# Altium footprint library ref-packages-longpad.PCBLIB: 1527 footprints (part 13 of 103)
Each footprint in its own frame and in the unit in brackets; x right, y up, seen from the top. Pads: shape width x height; smd on the part's side, far side on the other; paste and mask are expansions set on the pad; w line width, h text height; cw(c..) or ccw(c..) is an arc to the next point about the centre after c.
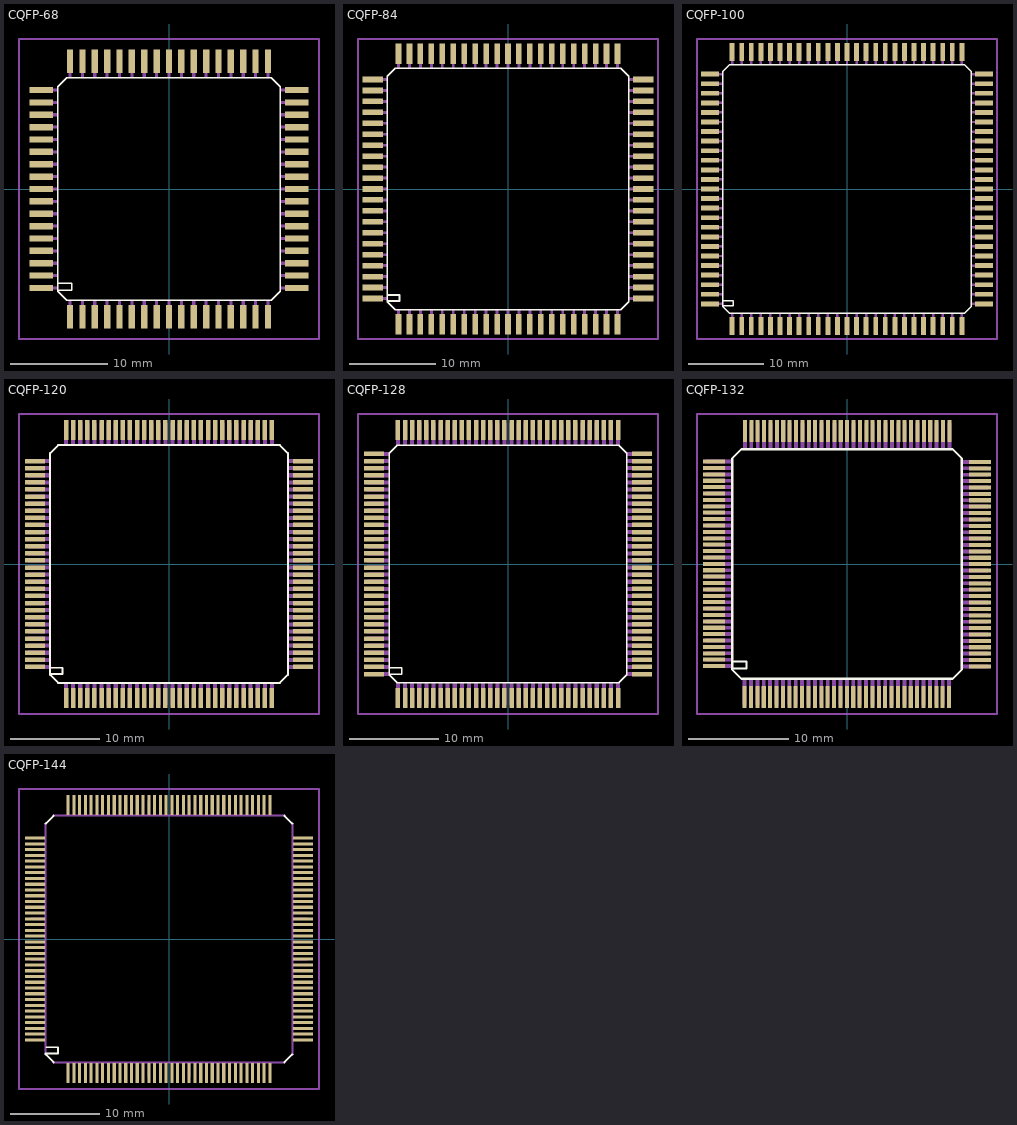
[diagram p12: the footprints below, top view; thin cyan lines are the x and y axes]

## CQFP-68 [mm]
pads (68):
  rect 0.65x2.4 smd: 1(-10.16,-13.1) 2(-8.89,-13.1) 3(-7.62,-13.1) 4(-6.35,-13.1) 5(-5.08,-13.1) 6(-3.81,-13.1) 7(-2.54,-13.1) 8(-1.27,-13.1) 9(0,-13.1) 10(1.27,-13.1) 11(2.54,-13.1) 12(3.81,-13.1) 13(5.08,-13.1) 14(6.35,-13.1) 15(7.62,-13.1) 16(8.89,-13.1) 17(10.16,-13.1) 35(10.16,13.1) 36(8.89,13.1) 37(7.62,13.1) 38(6.35,13.1) 39(5.08,13.1) 40(3.81,13.1) 41(2.54,13.1) 42(1.27,13.1) 43(0,13.1) 44(-1.27,13.1) 45(-2.54,13.1) 46(-3.81,13.1) 47(-5.08,13.1) 48(-6.35,13.1) 49(-7.62,13.1) 50(-8.89,13.1) 51(-10.16,13.1)
  rect 2.4x0.65 smd: 18(13.1,-10.16) 19(13.1,-8.89) 20(13.1,-7.62) 21(13.1,-6.35) 22(13.1,-5.08) 23(13.1,-3.81) 24(13.1,-2.54) 25(13.1,-1.27) 26(13.1,0) 27(13.1,1.27) 28(13.1,2.54) 29(13.1,3.81) 30(13.1,5.08) 31(13.1,6.35) 32(13.1,7.62) 33(13.1,8.89) 34(13.1,10.16) 52(-13.1,10.16) 53(-13.1,8.89) 54(-13.1,7.62) 55(-13.1,6.35) 56(-13.1,5.08) 57(-13.1,3.81) 58(-13.1,2.54) 59(-13.1,1.27) 60(-13.1,0) 61(-13.1,-1.27) 62(-13.1,-2.54) 63(-13.1,-3.81) 64(-13.1,-5.08) 65(-13.1,-6.35) 66(-13.1,-7.62) 67(-13.1,-8.89) 68(-13.1,-10.16)
Top Overlay:
  lines w0.152: -11.3,-9.7 -10,-9.7 -10,-10.4 -11.4,-10.4 ; -11.4,-10.4 -11.4,10.5 -10.5,11.4 10.5,11.4 11.4,10.5 11.4,-10.5 10.5,-11.4 -10.5,-11.4 -11.4,-10.5 -11.4,-10.4
Mechanical 16:
  rectangle: -10.32,-13.9 -10,-11.4
  rectangle: -9.05,-13.9 -8.73,-11.4
  rectangle: -7.78,-13.9 -7.46,-11.4
  rectangle: -6.51,-13.9 -6.19,-11.4
  rectangle: -5.24,-13.9 -4.92,-11.4
  rectangle: -3.97,-13.9 -3.65,-11.4
  rectangle: -2.7,-13.9 -2.38,-11.4
  rectangle: -1.43,-13.9 -1.11,-11.4
  rectangle: -0.16,-13.9 0.16,-11.4
  rectangle: 1.11,-13.9 1.43,-11.4
  rectangle: 2.38,-13.9 2.7,-11.4
  rectangle: 3.65,-13.9 3.97,-11.4
  rectangle: 4.92,-13.9 5.24,-11.4
  rectangle: 6.19,-13.9 6.51,-11.4
  rectangle: 7.46,-13.9 7.78,-11.4
  rectangle: 8.73,-13.9 9.05,-11.4
  rectangle: 10,-13.9 10.32,-11.4
  rectangle: 11.4,-10.32 13.9,-10
  rectangle: 11.4,-9.05 13.9,-8.73
  rectangle: 11.4,-7.78 13.9,-7.46
  rectangle: 11.4,-6.51 13.9,-6.19
  rectangle: 11.4,-5.24 13.9,-4.92
  rectangle: 11.4,-3.97 13.9,-3.65
  rectangle: 11.4,-2.7 13.9,-2.38
  rectangle: 11.4,-1.43 13.9,-1.11
  rectangle: 11.4,-0.16 13.9,0.16
  rectangle: 11.4,1.11 13.9,1.43
  rectangle: 11.4,2.38 13.9,2.7
  rectangle: 11.4,3.65 13.9,3.97
  rectangle: 11.4,4.92 13.9,5.24
  rectangle: 11.4,6.19 13.9,6.51
  rectangle: 11.4,7.46 13.9,7.78
  rectangle: 11.4,8.73 13.9,9.05
  rectangle: 11.4,10 13.9,10.32
  rectangle: 10,11.4 10.32,13.9
  rectangle: 8.73,11.4 9.05,13.9
  rectangle: 7.46,11.4 7.78,13.9
  rectangle: 6.19,11.4 6.51,13.9
  rectangle: 4.92,11.4 5.24,13.9
  rectangle: 3.65,11.4 3.97,13.9
  rectangle: 2.38,11.4 2.7,13.9
  rectangle: 1.11,11.4 1.43,13.9
  rectangle: -0.16,11.4 0.16,13.9
  rectangle: -1.43,11.4 -1.11,13.9
  rectangle: -2.7,11.4 -2.38,13.9
  rectangle: -3.97,11.4 -3.65,13.9
  rectangle: -5.24,11.4 -4.92,13.9
  rectangle: -6.51,11.4 -6.19,13.9
  rectangle: -7.78,11.4 -7.46,13.9
  rectangle: -9.05,11.4 -8.73,13.9
  rectangle: -10.32,11.4 -10,13.9
  rectangle: -13.9,10 -11.4,10.32
  rectangle: -13.9,8.73 -11.4,9.05
  rectangle: -13.9,7.46 -11.4,7.78
  rectangle: -13.9,6.19 -11.4,6.51
  rectangle: -13.9,4.92 -11.4,5.24
  rectangle: -13.9,3.65 -11.4,3.97
  rectangle: -13.9,2.38 -11.4,2.7
  rectangle: -13.9,1.11 -11.4,1.43
  rectangle: -13.9,-0.16 -11.4,0.16
  rectangle: -13.9,-1.43 -11.4,-1.11
  rectangle: -13.9,-2.7 -11.4,-2.38
  rectangle: -13.9,-3.97 -11.4,-3.65
  rectangle: -13.9,-5.24 -11.4,-4.92
  rectangle: -13.9,-6.51 -11.4,-6.19
  rectangle: -13.9,-7.78 -11.4,-7.46
  rectangle: -13.9,-9.05 -11.4,-8.73
  rectangle: -13.9,-10.32 -11.4,-10
Mechanical 27:
  lines w0.2: -15.403,-15.403 15.403,-15.403 15.403,15.403 -15.403,15.403 -15.403,-15.403

## CQFP-84 [mm]
pads (84):
  rect 0.65x2.4 smd: 1(-12.7,-15.7) 2(-11.43,-15.7) 3(-10.16,-15.7) 4(-8.89,-15.7) 5(-7.62,-15.7) 6(-6.35,-15.7) 7(-5.08,-15.7) 8(-3.81,-15.7) 9(-2.54,-15.7) 10(-1.27,-15.7) 11(0,-15.7) 12(1.27,-15.7) 13(2.54,-15.7) 14(3.81,-15.7) 15(5.08,-15.7) 16(6.35,-15.7) 17(7.62,-15.7) 18(8.89,-15.7) 19(10.16,-15.7) 20(11.43,-15.7) 21(12.7,-15.7) 43(12.7,15.7) 44(11.43,15.7) 45(10.16,15.7) 46(8.89,15.7) 47(7.62,15.7) 48(6.35,15.7) 49(5.08,15.7) 50(3.81,15.7) 51(2.54,15.7) 52(1.27,15.7) 53(0,15.7) 54(-1.27,15.7) 55(-2.54,15.7) 56(-3.81,15.7) 57(-5.08,15.7) 58(-6.35,15.7) 59(-7.62,15.7) 60(-8.89,15.7) 61(-10.16,15.7) 62(-11.43,15.7) 63(-12.7,15.7)
  rect 2.4x0.65 smd: 22(15.7,-12.7) 23(15.7,-11.43) 24(15.7,-10.16) 25(15.7,-8.89) 26(15.7,-7.62) 27(15.7,-6.35) 28(15.7,-5.08) 29(15.7,-3.81) 30(15.7,-2.54) 31(15.7,-1.27) 32(15.7,0) 33(15.7,1.27) 34(15.7,2.54) 35(15.7,3.81) 36(15.7,5.08) 37(15.7,6.35) 38(15.7,7.62) 39(15.7,8.89) 40(15.7,10.16) 41(15.7,11.43) 42(15.7,12.7) 64(-15.7,12.7) 65(-15.7,11.43) 66(-15.7,10.16) 67(-15.7,8.89) 68(-15.7,7.62) 69(-15.7,6.35) 70(-15.7,5.08) 71(-15.7,3.81) 72(-15.7,2.54) 73(-15.7,1.27) 74(-15.7,0) 75(-15.7,-1.27) 76(-15.7,-2.54) 77(-15.7,-3.81) 78(-15.7,-5.08) 79(-15.7,-6.35) 80(-15.7,-7.62) 81(-15.7,-8.89) 82(-15.7,-10.16) 83(-15.7,-11.43) 84(-15.7,-12.7)
Top Overlay:
  lines w0.203: -13.9,-12.3 -12.6,-12.3 -12.6,-13 -14,-13 ; -14,-13 -14,13.1 -13.1,14 13.1,14 14,13.1 14,-13.1 13.1,-14 -13.1,-14 -14,-13.1 -14,-13
Mechanical 16:
  rectangle: -12.86,-16.5 -12.54,-14
  rectangle: -11.59,-16.5 -11.27,-14
  rectangle: -10.32,-16.5 -10,-14
  rectangle: -9.05,-16.5 -8.73,-14
  rectangle: -7.78,-16.5 -7.46,-14
  rectangle: -6.51,-16.5 -6.19,-14
  rectangle: -5.24,-16.5 -4.92,-14
  rectangle: -3.97,-16.5 -3.65,-14
  rectangle: -2.7,-16.5 -2.38,-14
  rectangle: -1.43,-16.5 -1.11,-14
  rectangle: -0.16,-16.5 0.16,-14
  rectangle: 1.11,-16.5 1.43,-14
  rectangle: 2.38,-16.5 2.7,-14
  rectangle: 3.65,-16.5 3.97,-14
  rectangle: 4.92,-16.5 5.24,-14
  rectangle: 6.19,-16.5 6.51,-14
  rectangle: 7.46,-16.5 7.78,-14
  rectangle: 8.73,-16.5 9.05,-14
  rectangle: 10,-16.5 10.32,-14
  rectangle: 11.27,-16.5 11.59,-14
  rectangle: 12.54,-16.5 12.86,-14
  rectangle: 14,-12.86 16.5,-12.54
  rectangle: 14,-11.59 16.5,-11.27
  rectangle: 14,-10.32 16.5,-10
  rectangle: 14,-9.05 16.5,-8.73
  rectangle: 14,-7.78 16.5,-7.46
  rectangle: 14,-6.51 16.5,-6.19
  rectangle: 14,-5.24 16.5,-4.92
  rectangle: 14,-3.97 16.5,-3.65
  rectangle: 14,-2.7 16.5,-2.38
  rectangle: 14,-1.43 16.5,-1.11
  rectangle: 14,-0.16 16.5,0.16
  rectangle: 14,1.11 16.5,1.43
  rectangle: 14,2.38 16.5,2.7
  rectangle: 14,3.65 16.5,3.97
  rectangle: 14,4.92 16.5,5.24
  rectangle: 14,6.19 16.5,6.51
  rectangle: 14,7.46 16.5,7.78
  rectangle: 14,8.73 16.5,9.05
  rectangle: 14,10 16.5,10.32
  rectangle: 14,11.27 16.5,11.59
  rectangle: 14,12.54 16.5,12.86
  rectangle: 12.54,14 12.86,16.5
  rectangle: 11.27,14 11.59,16.5
  rectangle: 10,14 10.32,16.5
  rectangle: 8.73,14 9.05,16.5
  rectangle: 7.46,14 7.78,16.5
  rectangle: 6.19,14 6.51,16.5
  rectangle: 4.92,14 5.24,16.5
  rectangle: 3.65,14 3.97,16.5
  rectangle: 2.38,14 2.7,16.5
  rectangle: 1.11,14 1.43,16.5
  rectangle: -0.16,14 0.16,16.5
  rectangle: -1.43,14 -1.11,16.5
  rectangle: -2.7,14 -2.38,16.5
  rectangle: -3.97,14 -3.65,16.5
  rectangle: -5.24,14 -4.92,16.5
  rectangle: -6.51,14 -6.19,16.5
  rectangle: -7.78,14 -7.46,16.5
  rectangle: -9.05,14 -8.73,16.5
  rectangle: -10.32,14 -10,16.5
  rectangle: -11.59,14 -11.27,16.5
  rectangle: -12.86,14 -12.54,16.5
  rectangle: -16.5,12.54 -14,12.86
  rectangle: -16.5,11.27 -14,11.59
  rectangle: -16.5,10 -14,10.32
  rectangle: -16.5,8.73 -14,9.05
  rectangle: -16.5,7.46 -14,7.78
  rectangle: -16.5,6.19 -14,6.51
  rectangle: -16.5,4.92 -14,5.24
  rectangle: -16.5,3.65 -14,3.97
  rectangle: -16.5,2.38 -14,2.7
  rectangle: -16.5,1.11 -14,1.43
  rectangle: -16.5,-0.16 -14,0.16
  rectangle: -16.5,-1.43 -14,-1.11
  rectangle: -16.5,-2.7 -14,-2.38
  rectangle: -16.5,-3.97 -14,-3.65
  rectangle: -16.5,-5.24 -14,-4.92
  rectangle: -16.5,-6.51 -14,-6.19
  rectangle: -16.5,-7.78 -14,-7.46
  rectangle: -16.5,-9.05 -14,-8.73
  rectangle: -16.5,-10.32 -14,-10
  rectangle: -16.5,-11.59 -14,-11.27
  rectangle: -16.5,-12.86 -14,-12.54
Mechanical 27:
  lines w0.2: -17.403,-17.403 17.403,-17.403 17.403,17.403 -17.403,17.403 -17.403,-17.403

## CQFP-100 [mm]
pads (100):
  rect 0.65x2.4 smd: 1(-15.24,-18.2) 2(-13.97,-18.2) 3(-12.7,-18.2) 4(-11.43,-18.2) 5(-10.16,-18.2) 6(-8.89,-18.2) 7(-7.62,-18.2) 8(-6.35,-18.2) 9(-5.08,-18.2) 10(-3.81,-18.2) 11(-2.54,-18.2) 12(-1.27,-18.2) 13(0,-18.2) 14(1.27,-18.2) 15(2.54,-18.2) 16(3.81,-18.2) 17(5.08,-18.2) 18(6.35,-18.2) 19(7.62,-18.2) 20(8.89,-18.2) 21(10.16,-18.2) 22(11.43,-18.2) 23(12.7,-18.2) 24(13.97,-18.2) 25(15.24,-18.2) 51(15.24,18.2) 52(13.97,18.2) 53(12.7,18.2) 54(11.43,18.2) 55(10.16,18.2) 56(8.89,18.2) 57(7.62,18.2) 58(6.35,18.2) 59(5.08,18.2) 60(3.81,18.2) 61(2.54,18.2) 62(1.27,18.2) 63(0,18.2) 64(-1.27,18.2) 65(-2.54,18.2) 66(-3.81,18.2) 67(-5.08,18.2) 68(-6.35,18.2) 69(-7.62,18.2) 70(-8.89,18.2) 71(-10.16,18.2) 72(-11.43,18.2) 73(-12.7,18.2) 74(-13.97,18.2) 75(-15.24,18.2)
  rect 2.4x0.65 smd: 26(18.2,-15.24) 27(18.2,-13.97) 28(18.2,-12.7) 29(18.2,-11.43) 30(18.2,-10.16) 31(18.2,-8.89) 32(18.2,-7.62) 33(18.2,-6.35) 34(18.2,-5.08) 35(18.2,-3.81) 36(18.2,-2.54) 37(18.2,-1.27) 38(18.2,0) 39(18.2,1.27) 40(18.2,2.54) 41(18.2,3.81) 42(18.2,5.08) 43(18.2,6.35) 44(18.2,7.62) 45(18.2,8.89) 46(18.2,10.16) 47(18.2,11.43) 48(18.2,12.7) 49(18.2,13.97) 50(18.2,15.24) 76(-18.2,15.24) 77(-18.2,13.97) 78(-18.2,12.7) 79(-18.2,11.43) 80(-18.2,10.16) 81(-18.2,8.89) 82(-18.2,7.62) 83(-18.2,6.35) 84(-18.2,5.08) 85(-18.2,3.81) 86(-18.2,2.54) 87(-18.2,1.27) 88(-18.2,0) 89(-18.2,-1.27) 90(-18.2,-2.54) 91(-18.2,-3.81) 92(-18.2,-5.08) 93(-18.2,-6.35) 94(-18.2,-7.62) 95(-18.2,-8.89) 96(-18.2,-10.16) 97(-18.2,-11.43) 98(-18.2,-12.7) 99(-18.2,-13.97) 100(-18.2,-15.24)
Top Overlay:
  lines w0.203: -16.4,-14.8 -15.1,-14.8 -15.1,-15.5 -16.5,-15.5 ; -16.5,-15.5 -16.5,15.6 -15.6,16.5 15.6,16.5 16.5,15.6 16.5,-15.6 15.6,-16.5 -15.6,-16.5 -16.5,-15.6 -16.5,-15.5
Mechanical 16:
  rectangle: -15.4,-19 -15.08,-16.5
  rectangle: -14.13,-19 -13.81,-16.5
  rectangle: -12.86,-19 -12.54,-16.5
  rectangle: -11.59,-19 -11.27,-16.5
  rectangle: -10.32,-19 -10,-16.5
  rectangle: -9.05,-19 -8.73,-16.5
  rectangle: -7.78,-19 -7.46,-16.5
  rectangle: -6.51,-19 -6.19,-16.5
  rectangle: -5.24,-19 -4.92,-16.5
  rectangle: -3.97,-19 -3.65,-16.5
  rectangle: -2.7,-19 -2.38,-16.5
  rectangle: -1.43,-19 -1.11,-16.5
  rectangle: -0.16,-19 0.16,-16.5
  rectangle: 1.11,-19 1.43,-16.5
  rectangle: 2.38,-19 2.7,-16.5
  rectangle: 3.65,-19 3.97,-16.5
  rectangle: 4.92,-19 5.24,-16.5
  rectangle: 6.19,-19 6.51,-16.5
  rectangle: 7.46,-19 7.78,-16.5
  rectangle: 8.73,-19 9.05,-16.5
  rectangle: 10,-19 10.32,-16.5
  rectangle: 11.27,-19 11.59,-16.5
  rectangle: 12.54,-19 12.86,-16.5
  rectangle: 13.81,-19 14.13,-16.5
  rectangle: 15.08,-19 15.4,-16.5
  rectangle: 16.5,-15.4 19,-15.08
  rectangle: 16.5,-14.13 19,-13.81
  rectangle: 16.5,-12.86 19,-12.54
  rectangle: 16.5,-11.59 19,-11.27
  rectangle: 16.5,-10.32 19,-10
  rectangle: 16.5,-9.05 19,-8.73
  rectangle: 16.5,-7.78 19,-7.46
  rectangle: 16.5,-6.51 19,-6.19
  rectangle: 16.5,-5.24 19,-4.92
  rectangle: 16.5,-3.97 19,-3.65
  rectangle: 16.5,-2.7 19,-2.38
  rectangle: 16.5,-1.43 19,-1.11
  rectangle: 16.5,-0.16 19,0.16
  rectangle: 16.5,1.11 19,1.43
  rectangle: 16.5,2.38 19,2.7
  rectangle: 16.5,3.65 19,3.97
  rectangle: 16.5,4.92 19,5.24
  rectangle: 16.5,6.19 19,6.51
  rectangle: 16.5,7.46 19,7.78
  rectangle: 16.5,8.73 19,9.05
  rectangle: 16.5,10 19,10.32
  rectangle: 16.5,11.27 19,11.59
  rectangle: 16.5,12.54 19,12.86
  rectangle: 16.5,13.81 19,14.13
  rectangle: 16.5,15.08 19,15.4
  rectangle: 15.08,16.5 15.4,19
  rectangle: 13.81,16.5 14.13,19
  rectangle: 12.54,16.5 12.86,19
  rectangle: 11.27,16.5 11.59,19
  rectangle: 10,16.5 10.32,19
  rectangle: 8.73,16.5 9.05,19
  rectangle: 7.46,16.5 7.78,19
  rectangle: 6.19,16.5 6.51,19
  rectangle: 4.92,16.5 5.24,19
  rectangle: 3.65,16.5 3.97,19
  rectangle: 2.38,16.5 2.7,19
  rectangle: 1.11,16.5 1.43,19
  rectangle: -0.16,16.5 0.16,19
  rectangle: -1.43,16.5 -1.11,19
  rectangle: -2.7,16.5 -2.38,19
  rectangle: -3.97,16.5 -3.65,19
  rectangle: -5.24,16.5 -4.92,19
  rectangle: -6.51,16.5 -6.19,19
  rectangle: -7.78,16.5 -7.46,19
  rectangle: -9.05,16.5 -8.73,19
  rectangle: -10.32,16.5 -10,19
  rectangle: -11.59,16.5 -11.27,19
  rectangle: -12.86,16.5 -12.54,19
  rectangle: -14.13,16.5 -13.81,19
  rectangle: -15.4,16.5 -15.08,19
  rectangle: -19,15.08 -16.5,15.4
  rectangle: -19,13.81 -16.5,14.13
  rectangle: -19,12.54 -16.5,12.86
  rectangle: -19,11.27 -16.5,11.59
  rectangle: -19,10 -16.5,10.32
  rectangle: -19,8.73 -16.5,9.05
  rectangle: -19,7.46 -16.5,7.78
  rectangle: -19,6.19 -16.5,6.51
  rectangle: -19,4.92 -16.5,5.24
  rectangle: -19,3.65 -16.5,3.97
  rectangle: -19,2.38 -16.5,2.7
  rectangle: -19,1.11 -16.5,1.43
  rectangle: -19,-0.16 -16.5,0.16
  rectangle: -19,-1.43 -16.5,-1.11
  rectangle: -19,-2.7 -16.5,-2.38
  rectangle: -19,-3.97 -16.5,-3.65
  rectangle: -19,-5.24 -16.5,-4.92
  rectangle: -19,-6.51 -16.5,-6.19
  rectangle: -19,-7.78 -16.5,-7.46
  rectangle: -19,-9.05 -16.5,-8.73
  rectangle: -19,-10.32 -16.5,-10
  rectangle: -19,-11.59 -16.5,-11.27
  rectangle: -19,-12.86 -16.5,-12.54
  rectangle: -19,-14.13 -16.5,-13.81
  rectangle: -19,-15.4 -16.5,-15.08
Mechanical 27:
  lines w0.2: -19.903,-19.903 19.903,-19.903 19.903,19.903 -19.903,19.903 -19.903,-19.903

## CQFP-120 [mm]
pads (120):
  rect 0.5x2.2 smd: 1(-11.6,-15.1) 2(-10.8,-15.1) 3(-10,-15.1) 4(-9.2,-15.1) 5(-8.4,-15.1) 6(-7.6,-15.1) 7(-6.8,-15.1) 8(-6,-15.1) 9(-5.2,-15.1) 10(-4.4,-15.1) 11(-3.6,-15.1) 12(-2.8,-15.1) 13(-2,-15.1) 14(-1.2,-15.1) 15(-0.4,-15.1) 16(0.4,-15.1) 17(1.2,-15.1) 18(2,-15.1) 19(2.8,-15.1) 20(3.6,-15.1) 21(4.4,-15.1) 22(5.2,-15.1) 23(6,-15.1) 24(6.8,-15.1) 25(7.6,-15.1) 26(8.4,-15.1) 27(9.2,-15.1) 28(10,-15.1) 29(10.8,-15.1) 30(11.6,-15.1) 61(11.6,15.1) 62(10.8,15.1) 63(10,15.1) 64(9.2,15.1) 65(8.4,15.1) 66(7.6,15.1) 67(6.8,15.1) 68(6,15.1) 69(5.2,15.1) 70(4.4,15.1) 71(3.6,15.1) 72(2.8,15.1) 73(2,15.1) 74(1.2,15.1) 75(0.4,15.1) 76(-0.4,15.1) 77(-1.2,15.1) 78(-2,15.1) 79(-2.8,15.1) 80(-3.6,15.1) 81(-4.4,15.1) 82(-5.2,15.1) 83(-6,15.1) 84(-6.8,15.1) 85(-7.6,15.1) 86(-8.4,15.1) 87(-9.2,15.1) 88(-10,15.1) 89(-10.8,15.1) 90(-11.6,15.1)
  rect 2.2x0.5 smd: 31(15.1,-11.6) 32(15.1,-10.8) 33(15.1,-10) 34(15.1,-9.2) 35(15.1,-8.4) 36(15.1,-7.6) 37(15.1,-6.8) 38(15.1,-6) 39(15.1,-5.2) 40(15.1,-4.4) 41(15.1,-3.6) 42(15.1,-2.8) 43(15.1,-2) 44(15.1,-1.2) 45(15.1,-0.4) 46(15.1,0.4) 47(15.1,1.2) 48(15.1,2) 49(15.1,2.8) 50(15.1,3.6) 51(15.1,4.4) 52(15.1,5.2) 53(15.1,6) 54(15.1,6.8) 55(15.1,7.6) 56(15.1,8.4) 57(15.1,9.2) 58(15.1,10) 59(15.1,10.8) 60(15.1,11.6) 91(-15.1,11.6) 92(-15.1,10.8) 93(-15.1,10) 94(-15.1,9.2) 95(-15.1,8.4) 96(-15.1,7.6) 97(-15.1,6.8) 98(-15.1,6) 99(-15.1,5.2) 100(-15.1,4.4) 101(-15.1,3.6) 102(-15.1,2.8) 103(-15.1,2) 104(-15.1,1.2) 105(-15.1,0.4) 106(-15.1,-0.4) 107(-15.1,-1.2) 108(-15.1,-2) 109(-15.1,-2.8) 110(-15.1,-3.6) 111(-15.1,-4.4) 112(-15.1,-5.2) 113(-15.1,-6) 114(-15.1,-6.8) 115(-15.1,-7.6) 116(-15.1,-8.4) 117(-15.1,-9.2) 118(-15.1,-10) 119(-15.1,-10.8) 120(-15.1,-11.6)
Top Overlay:
  lines w0.203: -13.3,-11.7 -12,-11.7 -12,-12.4 -13.4,-12.4 ; -13.4,-12.4 -13.4,12.5 -12.5,13.4 12.5,13.4 13.4,12.5 13.4,-12.5 12.5,-13.4 -12.5,-13.4 -13.4,-12.5 -13.4,-12.4
Mechanical 16:
  rectangle: -11.83,-15.89 -11.37,-13.4
  rectangle: -11.03,-15.89 -10.57,-13.4
  rectangle: -10.23,-15.89 -9.77,-13.4
  rectangle: -9.43,-15.89 -8.97,-13.4
  rectangle: -8.63,-15.89 -8.17,-13.4
  rectangle: -7.83,-15.89 -7.37,-13.4
  rectangle: -7.03,-15.89 -6.57,-13.4
  rectangle: -6.23,-15.89 -5.77,-13.4
  rectangle: -5.43,-15.89 -4.97,-13.4
  rectangle: -4.63,-15.89 -4.17,-13.4
  rectangle: -3.83,-15.89 -3.37,-13.4
  rectangle: -3.03,-15.89 -2.57,-13.4
  rectangle: -2.23,-15.89 -1.77,-13.4
  rectangle: -1.43,-15.89 -0.97,-13.4
  rectangle: -0.63,-15.89 -0.17,-13.4
  rectangle: 0.17,-15.89 0.63,-13.4
  rectangle: 0.97,-15.89 1.43,-13.4
  rectangle: 1.77,-15.89 2.23,-13.4
  rectangle: 2.57,-15.89 3.03,-13.4
  rectangle: 3.37,-15.89 3.83,-13.4
  rectangle: 4.17,-15.89 4.63,-13.4
  rectangle: 4.97,-15.89 5.43,-13.4
  rectangle: 5.77,-15.89 6.23,-13.4
  rectangle: 6.57,-15.89 7.03,-13.4
  rectangle: 7.37,-15.89 7.83,-13.4
  rectangle: 8.17,-15.89 8.63,-13.4
  rectangle: 8.97,-15.89 9.43,-13.4
  rectangle: 9.77,-15.89 10.23,-13.4
  rectangle: 10.57,-15.89 11.03,-13.4
  rectangle: 11.37,-15.89 11.83,-13.4
  rectangle: 13.4,-11.83 15.89,-11.37
  rectangle: 13.4,-11.03 15.89,-10.57
  rectangle: 13.4,-10.23 15.89,-9.77
  rectangle: 13.4,-9.43 15.89,-8.97
  rectangle: 13.4,-8.63 15.89,-8.17
  rectangle: 13.4,-7.83 15.89,-7.37
  rectangle: 13.4,-7.03 15.89,-6.57
  rectangle: 13.4,-6.23 15.89,-5.77
  rectangle: 13.4,-5.43 15.89,-4.97
  rectangle: 13.4,-4.63 15.89,-4.17
  rectangle: 13.4,-3.83 15.89,-3.37
  rectangle: 13.4,-3.03 15.89,-2.57
  rectangle: 13.4,-2.23 15.89,-1.77
  rectangle: 13.4,-1.43 15.89,-0.97
  rectangle: 13.4,-0.63 15.89,-0.17
  rectangle: 13.4,0.17 15.89,0.63
  rectangle: 13.4,0.97 15.89,1.43
  rectangle: 13.4,1.77 15.89,2.23
  rectangle: 13.4,2.57 15.89,3.03
  rectangle: 13.4,3.37 15.89,3.83
  rectangle: 13.4,4.17 15.89,4.63
  rectangle: 13.4,4.97 15.89,5.43
  rectangle: 13.4,5.77 15.89,6.23
  rectangle: 13.4,6.57 15.89,7.03
  rectangle: 13.4,7.37 15.89,7.83
  rectangle: 13.4,8.17 15.89,8.63
  rectangle: 13.4,8.97 15.89,9.43
  rectangle: 13.4,9.77 15.89,10.23
  rectangle: 13.4,10.57 15.89,11.03
  rectangle: 13.4,11.37 15.89,11.83
  rectangle: 11.37,13.4 11.83,15.89
  rectangle: 10.57,13.4 11.03,15.89
  rectangle: 9.77,13.4 10.23,15.89
  rectangle: 8.97,13.4 9.43,15.89
  rectangle: 8.17,13.4 8.63,15.89
  rectangle: 7.37,13.4 7.83,15.89
  rectangle: 6.57,13.4 7.03,15.89
  rectangle: 5.77,13.4 6.23,15.89
  rectangle: 4.97,13.4 5.43,15.89
  rectangle: 4.17,13.4 4.63,15.89
  rectangle: 3.37,13.4 3.83,15.89
  rectangle: 2.57,13.4 3.03,15.89
  rectangle: 1.77,13.4 2.23,15.89
  rectangle: 0.97,13.4 1.43,15.89
  rectangle: 0.17,13.4 0.63,15.89
  rectangle: -0.63,13.4 -0.17,15.89
  rectangle: -1.43,13.4 -0.97,15.89
  rectangle: -2.23,13.4 -1.77,15.89
  rectangle: -3.03,13.4 -2.57,15.89
  rectangle: -3.83,13.4 -3.37,15.89
  rectangle: -4.63,13.4 -4.17,15.89
  rectangle: -5.43,13.4 -4.97,15.89
  rectangle: -6.23,13.4 -5.77,15.89
  rectangle: -7.03,13.4 -6.57,15.89
  rectangle: -7.83,13.4 -7.37,15.89
  rectangle: -8.63,13.4 -8.17,15.89
  rectangle: -9.43,13.4 -8.97,15.89
  rectangle: -10.23,13.4 -9.77,15.89
  rectangle: -11.03,13.4 -10.57,15.89
  rectangle: -11.83,13.4 -11.37,15.89
  rectangle: -15.89,11.37 -13.4,11.83
  rectangle: -15.89,10.57 -13.4,11.03
  rectangle: -15.89,9.77 -13.4,10.23
  rectangle: -15.89,8.97 -13.4,9.43
  rectangle: -15.89,8.17 -13.4,8.63
  rectangle: -15.89,7.37 -13.4,7.83
  rectangle: -15.89,6.57 -13.4,7.03
  rectangle: -15.89,5.77 -13.4,6.23
  rectangle: -15.89,4.97 -13.4,5.43
  rectangle: -15.89,4.17 -13.4,4.63
  rectangle: -15.89,3.37 -13.4,3.83
  rectangle: -15.89,2.57 -13.4,3.03
  rectangle: -15.89,1.77 -13.4,2.23
  rectangle: -15.89,0.97 -13.4,1.43
  rectangle: -15.89,0.17 -13.4,0.63
  rectangle: -15.89,-0.63 -13.4,-0.17
  rectangle: -15.89,-1.43 -13.4,-0.97
  rectangle: -15.89,-2.23 -13.4,-1.77
  rectangle: -15.89,-3.03 -13.4,-2.57
  rectangle: -15.89,-3.83 -13.4,-3.37
  rectangle: -15.89,-4.63 -13.4,-4.17
  rectangle: -15.89,-5.43 -13.4,-4.97
  rectangle: -15.89,-6.23 -13.4,-5.77
  rectangle: -15.89,-7.03 -13.4,-6.57
  rectangle: -15.89,-7.83 -13.4,-7.37
  rectangle: -15.89,-8.63 -13.4,-8.17
  rectangle: -15.89,-9.43 -13.4,-8.97
  rectangle: -15.89,-10.23 -13.4,-9.77
  rectangle: -15.89,-11.03 -13.4,-10.57
  rectangle: -15.89,-11.83 -13.4,-11.37
Mechanical 27:
  lines w0.2: -16.903,-16.903 16.903,-16.903 16.903,16.903 -16.903,16.903 -16.903,-16.903

## CQFP-128 [mm]
pads (128):
  rect 0.5x2.2 smd: 1(-12.4,-15.1) 2(-11.6,-15.1) 3(-10.8,-15.1) 4(-10,-15.1) 5(-9.2,-15.1) 6(-8.4,-15.1) 7(-7.6,-15.1) 8(-6.8,-15.1) 9(-6,-15.1) 10(-5.2,-15.1) 11(-4.4,-15.1) 12(-3.6,-15.1) 13(-2.8,-15.1) 14(-2,-15.1) 15(-1.2,-15.1) 16(-0.4,-15.1) 17(0.4,-15.1) 18(1.2,-15.1) 19(2,-15.1) 20(2.8,-15.1) 21(3.6,-15.1) 22(4.4,-15.1) 23(5.2,-15.1) 24(6,-15.1) 25(6.8,-15.1) 26(7.6,-15.1) 27(8.4,-15.1) 28(9.2,-15.1) 29(10,-15.1) 30(10.8,-15.1) 31(11.6,-15.1) 32(12.4,-15.1) 65(12.4,15.1) 66(11.6,15.1) 67(10.8,15.1) 68(10,15.1) 69(9.2,15.1) 70(8.4,15.1) 71(7.6,15.1) 72(6.8,15.1) 73(6,15.1) 74(5.2,15.1) 75(4.4,15.1) 76(3.6,15.1) 77(2.8,15.1) 78(2,15.1) 79(1.2,15.1) 80(0.4,15.1) 81(-0.4,15.1) 82(-1.2,15.1) 83(-2,15.1) 84(-2.8,15.1) 85(-3.6,15.1) 86(-4.4,15.1) 87(-5.2,15.1) 88(-6,15.1) 89(-6.8,15.1) 90(-7.6,15.1) 91(-8.4,15.1) 92(-9.2,15.1) 93(-10,15.1) 94(-10.8,15.1) 95(-11.6,15.1) 96(-12.4,15.1)
  rect 2.2x0.5 smd: 33(15.1,-12.4) 34(15.1,-11.6) 35(15.1,-10.8) 36(15.1,-10) 37(15.1,-9.2) 38(15.1,-8.4) 39(15.1,-7.6) 40(15.1,-6.8) 41(15.1,-6) 42(15.1,-5.2) 43(15.1,-4.4) 44(15.1,-3.6) 45(15.1,-2.8) 46(15.1,-2) 47(15.1,-1.2) 48(15.1,-0.4) 49(15.1,0.4) 50(15.1,1.2) 51(15.1,2) 52(15.1,2.8) 53(15.1,3.6) 54(15.1,4.4) 55(15.1,5.2) 56(15.1,6) 57(15.1,6.8) 58(15.1,7.6) 59(15.1,8.4) 60(15.1,9.2) 61(15.1,10) 62(15.1,10.8) 63(15.1,11.6) 64(15.1,12.4) 97(-15.1,12.4) 98(-15.1,11.6) 99(-15.1,10.8) 100(-15.1,10) 101(-15.1,9.2) 102(-15.1,8.4) 103(-15.1,7.6) 104(-15.1,6.8) 105(-15.1,6) 106(-15.1,5.2) 107(-15.1,4.4) 108(-15.1,3.6) 109(-15.1,2.8) 110(-15.1,2) 111(-15.1,1.2) 112(-15.1,0.4) 113(-15.1,-0.4) 114(-15.1,-1.2) 115(-15.1,-2) 116(-15.1,-2.8) 117(-15.1,-3.6) 118(-15.1,-4.4) 119(-15.1,-5.2) 120(-15.1,-6) 121(-15.1,-6.8) 122(-15.1,-7.6) 123(-15.1,-8.4) 124(-15.1,-9.2) 125(-15.1,-10) 126(-15.1,-10.8) 127(-15.1,-11.6) 128(-15.1,-12.4)
Top Overlay:
  lines w0.152: -13.3,-11.7 -12,-11.7 -12,-12.4 -13.4,-12.4 ; -13.4,-12.4 -13.4,12.5 -12.5,13.4 12.5,13.4 13.4,12.5 13.4,-12.5 12.5,-13.4 -12.5,-13.4 -13.4,-12.5 -13.4,-12.4
Mechanical 16:
  rectangle: -12.63,-15.89 -12.17,-13.4
  rectangle: -11.83,-15.89 -11.37,-13.4
  rectangle: -11.03,-15.89 -10.57,-13.4
  rectangle: -10.23,-15.89 -9.77,-13.4
  rectangle: -9.43,-15.89 -8.97,-13.4
  rectangle: -8.63,-15.89 -8.17,-13.4
  rectangle: -7.83,-15.89 -7.37,-13.4
  rectangle: -7.03,-15.89 -6.57,-13.4
  rectangle: -6.23,-15.89 -5.77,-13.4
  rectangle: -5.43,-15.89 -4.97,-13.4
  rectangle: -4.63,-15.89 -4.17,-13.4
  rectangle: -3.83,-15.89 -3.37,-13.4
  rectangle: -3.03,-15.89 -2.57,-13.4
  rectangle: -2.23,-15.89 -1.77,-13.4
  rectangle: -1.43,-15.89 -0.97,-13.4
  rectangle: -0.63,-15.89 -0.17,-13.4
  rectangle: 0.17,-15.89 0.63,-13.4
  rectangle: 0.97,-15.89 1.43,-13.4
  rectangle: 1.77,-15.89 2.23,-13.4
  rectangle: 2.57,-15.89 3.03,-13.4
  rectangle: 3.37,-15.89 3.83,-13.4
  rectangle: 4.17,-15.89 4.63,-13.4
  rectangle: 4.97,-15.89 5.43,-13.4
  rectangle: 5.77,-15.89 6.23,-13.4
  rectangle: 6.57,-15.89 7.03,-13.4
  rectangle: 7.37,-15.89 7.83,-13.4
  rectangle: 8.17,-15.89 8.63,-13.4
  rectangle: 8.97,-15.89 9.43,-13.4
  rectangle: 9.77,-15.89 10.23,-13.4
  rectangle: 10.57,-15.89 11.03,-13.4
  rectangle: 11.37,-15.89 11.83,-13.4
  rectangle: 12.17,-15.89 12.63,-13.4
  rectangle: 13.4,-12.63 15.89,-12.17
  rectangle: 13.4,-11.83 15.89,-11.37
  rectangle: 13.4,-11.03 15.89,-10.57
  rectangle: 13.4,-10.23 15.89,-9.77
  rectangle: 13.4,-9.43 15.89,-8.97
  rectangle: 13.4,-8.63 15.89,-8.17
  rectangle: 13.4,-7.83 15.89,-7.37
  rectangle: 13.4,-7.03 15.89,-6.57
  rectangle: 13.4,-6.23 15.89,-5.77
  rectangle: 13.4,-5.43 15.89,-4.97
  rectangle: 13.4,-4.63 15.89,-4.17
  rectangle: 13.4,-3.83 15.89,-3.37
  rectangle: 13.4,-3.03 15.89,-2.57
  rectangle: 13.4,-2.23 15.89,-1.77
  rectangle: 13.4,-1.43 15.89,-0.97
  rectangle: 13.4,-0.63 15.89,-0.17
  rectangle: 13.4,0.17 15.89,0.63
  rectangle: 13.4,0.97 15.89,1.43
  rectangle: 13.4,1.77 15.89,2.23
  rectangle: 13.4,2.57 15.89,3.03
  rectangle: 13.4,3.37 15.89,3.83
  rectangle: 13.4,4.17 15.89,4.63
  rectangle: 13.4,4.97 15.89,5.43
  rectangle: 13.4,5.77 15.89,6.23
  rectangle: 13.4,6.57 15.89,7.03
  rectangle: 13.4,7.37 15.89,7.83
  rectangle: 13.4,8.17 15.89,8.63
  rectangle: 13.4,8.97 15.89,9.43
  rectangle: 13.4,9.77 15.89,10.23
  rectangle: 13.4,10.57 15.89,11.03
  rectangle: 13.4,11.37 15.89,11.83
  rectangle: 13.4,12.17 15.89,12.63
  rectangle: 12.17,13.4 12.63,15.89
  rectangle: 11.37,13.4 11.83,15.89
  rectangle: 10.57,13.4 11.03,15.89
  rectangle: 9.77,13.4 10.23,15.89
  rectangle: 8.97,13.4 9.43,15.89
  rectangle: 8.17,13.4 8.63,15.89
  rectangle: 7.37,13.4 7.83,15.89
  rectangle: 6.57,13.4 7.03,15.89
  rectangle: 5.77,13.4 6.23,15.89
  rectangle: 4.97,13.4 5.43,15.89
  rectangle: 4.17,13.4 4.63,15.89
  rectangle: 3.37,13.4 3.83,15.89
  rectangle: 2.57,13.4 3.03,15.89
  rectangle: 1.77,13.4 2.23,15.89
  rectangle: 0.97,13.4 1.43,15.89
  rectangle: 0.17,13.4 0.63,15.89
  rectangle: -0.63,13.4 -0.17,15.89
  rectangle: -1.43,13.4 -0.97,15.89
  rectangle: -2.23,13.4 -1.77,15.89
  rectangle: -3.03,13.4 -2.57,15.89
  rectangle: -3.83,13.4 -3.37,15.89
  rectangle: -4.63,13.4 -4.17,15.89
  rectangle: -5.43,13.4 -4.97,15.89
  rectangle: -6.23,13.4 -5.77,15.89
  rectangle: -7.03,13.4 -6.57,15.89
  rectangle: -7.83,13.4 -7.37,15.89
  rectangle: -8.63,13.4 -8.17,15.89
  rectangle: -9.43,13.4 -8.97,15.89
  rectangle: -10.23,13.4 -9.77,15.89
  rectangle: -11.03,13.4 -10.57,15.89
  rectangle: -11.83,13.4 -11.37,15.89
  rectangle: -12.63,13.4 -12.17,15.89
  rectangle: -15.89,12.17 -13.4,12.63
  rectangle: -15.89,11.37 -13.4,11.83
  rectangle: -15.89,10.57 -13.4,11.03
  rectangle: -15.89,9.77 -13.4,10.23
  rectangle: -15.89,8.97 -13.4,9.43
  rectangle: -15.89,8.17 -13.4,8.63
  rectangle: -15.89,7.37 -13.4,7.83
  rectangle: -15.89,6.57 -13.4,7.03
  rectangle: -15.89,5.77 -13.4,6.23
  rectangle: -15.89,4.97 -13.4,5.43
  rectangle: -15.89,4.17 -13.4,4.63
  rectangle: -15.89,3.37 -13.4,3.83
  rectangle: -15.89,2.57 -13.4,3.03
  rectangle: -15.89,1.77 -13.4,2.23
  rectangle: -15.89,0.97 -13.4,1.43
  rectangle: -15.89,0.17 -13.4,0.63
  rectangle: -15.89,-0.63 -13.4,-0.17
  rectangle: -15.89,-1.43 -13.4,-0.97
  rectangle: -15.89,-2.23 -13.4,-1.77
  rectangle: -15.89,-3.03 -13.4,-2.57
  rectangle: -15.89,-3.83 -13.4,-3.37
  rectangle: -15.89,-4.63 -13.4,-4.17
  rectangle: -15.89,-5.43 -13.4,-4.97
  rectangle: -15.89,-6.23 -13.4,-5.77
  rectangle: -15.89,-7.03 -13.4,-6.57
  rectangle: -15.89,-7.83 -13.4,-7.37
  rectangle: -15.89,-8.63 -13.4,-8.17
  rectangle: -15.89,-9.43 -13.4,-8.97
  rectangle: -15.89,-10.23 -13.4,-9.77
  rectangle: -15.89,-11.03 -13.4,-10.57
  rectangle: -15.89,-11.83 -13.4,-11.37
  rectangle: -15.89,-12.63 -13.4,-12.17
Mechanical 27:
  lines w0.2: -16.903,-16.903 16.903,-16.903 16.903,16.903 -16.903,16.903 -16.903,-16.903

## CQFP-132 [mm]
pads (132):
  rect 0.4x2.2 smd: 1(-10.175,-13.2) 2(-9.54,-13.2) 3(-8.905,-13.2) 4(-8.27,-13.2) 5(-7.635,-13.2) 6(-7,-13.2) 7(-6.365,-13.2) 8(-5.73,-13.2) 9(-5.095,-13.2) 10(-4.46,-13.2) 11(-3.825,-13.2) 12(-3.19,-13.2) 13(-2.555,-13.2) 14(-1.92,-13.2) 15(-1.285,-13.2) 16(-0.65,-13.2) 17(-0.015,-13.2) 18(0.62,-13.2) 19(1.255,-13.2) 20(1.89,-13.2) 21(2.525,-13.2) 22(3.16,-13.2) 23(3.795,-13.2) 24(4.43,-13.2) 25(5.065,-13.2) 26(5.7,-13.2) 27(6.335,-13.2) 28(6.97,-13.2) 29(7.605,-13.2) 30(8.24,-13.2) 31(8.875,-13.2) 32(9.51,-13.2) 33(10.145,-13.2) 67(10.175,13.2) 68(9.54,13.2) 69(8.905,13.2) 70(8.27,13.2) 71(7.635,13.2) 72(7,13.2) 73(6.365,13.2) 74(5.73,13.2) 75(5.095,13.2) 76(4.46,13.2) 77(3.825,13.2) 78(3.19,13.2) 79(2.555,13.2) 80(1.92,13.2) 81(1.285,13.2) 82(0.65,13.2) 83(0.015,13.2) 84(-0.62,13.2) 85(-1.255,13.2) 86(-1.89,13.2) 87(-2.525,13.2) 88(-3.16,13.2) 89(-3.795,13.2) 90(-4.43,13.2) 91(-5.065,13.2) 92(-5.7,13.2) 93(-6.335,13.2) 94(-6.97,13.2) 95(-7.605,13.2) 96(-8.24,13.2) 97(-8.875,13.2) 98(-9.51,13.2) 99(-10.145,13.2)
  rect 2.2x0.4 smd: 34(13.2,-10.175) 35(13.2,-9.54) 36(13.2,-8.905) 37(13.2,-8.27) 38(13.2,-7.635) 39(13.2,-7) 40(13.2,-6.365) 41(13.2,-5.73) 42(13.2,-5.095) 43(13.2,-4.46) 44(13.2,-3.825) 45(13.2,-3.19) 46(13.2,-2.555) 47(13.2,-1.92) 48(13.2,-1.285) 49(13.2,-0.65) 50(13.2,-0.015) 51(13.2,0.62) 52(13.2,1.255) 53(13.2,1.89) 54(13.2,2.525) 55(13.2,3.16) 56(13.2,3.795) 57(13.2,4.43) 58(13.2,5.065) 59(13.2,5.7) 60(13.2,6.335) 61(13.2,6.97) 62(13.2,7.605) 63(13.2,8.24) 64(13.2,8.875) 65(13.2,9.51) 66(13.2,10.145) 100(-13.2,10.175) 101(-13.2,9.54) 102(-13.2,8.905) 103(-13.2,8.27) 104(-13.2,7.635) 105(-13.2,7) 106(-13.2,6.365) 107(-13.2,5.73) 108(-13.2,5.095) 109(-13.2,4.46) 110(-13.2,3.825) 111(-13.2,3.19) 112(-13.2,2.555) 113(-13.2,1.92) 114(-13.2,1.285) 115(-13.2,0.65) 116(-13.2,0.015) 117(-13.2,-0.62) 118(-13.2,-1.255) 119(-13.2,-1.89) 120(-13.2,-2.525) 121(-13.2,-3.16) 122(-13.2,-3.795) 123(-13.2,-4.43) 124(-13.2,-5.065) 125(-13.2,-5.7) 126(-13.2,-6.335) 127(-13.2,-6.97) 128(-13.2,-7.605) 129(-13.2,-8.24) 130(-13.2,-8.875) 131(-13.2,-9.51) 132(-13.2,-10.145)
Top Overlay:
  lines w0.203: -11.3,-9.7 -10,-9.7 -10,-10.4 -11.4,-10.4 ; -11.4,-10.4 -11.4,10.5 -10.5,11.4 10.5,11.4 11.4,10.5 11.4,-10.5 10.5,-11.4 -10.5,-11.4 -11.4,-10.5 -11.4,-10.4
Mechanical 16:
  rectangle: -10.365,-14 -9.985,-11.5
  rectangle: -9.73,-14 -9.35,-11.5
  rectangle: -9.095,-14 -8.715,-11.5
  rectangle: -8.46,-14 -8.08,-11.5
  rectangle: -7.825,-14 -7.445,-11.5
  rectangle: -7.19,-14 -6.81,-11.5
  rectangle: -6.555,-14 -6.175,-11.5
  rectangle: -5.92,-14 -5.54,-11.5
  rectangle: -5.285,-14 -4.905,-11.5
  rectangle: -4.65,-14 -4.27,-11.5
  rectangle: -4.015,-14 -3.635,-11.5
  rectangle: -3.38,-14 -3,-11.5
  rectangle: -2.745,-14 -2.365,-11.5
  rectangle: -2.11,-14 -1.73,-11.5
  rectangle: -1.475,-14 -1.095,-11.5
  rectangle: -0.84,-14 -0.46,-11.5
  rectangle: -0.205,-14 0.175,-11.5
  rectangle: 0.43,-14 0.81,-11.5
  rectangle: 1.065,-14 1.445,-11.5
  rectangle: 1.7,-14 2.08,-11.5
  rectangle: 2.335,-14 2.715,-11.5
  rectangle: 2.97,-14 3.35,-11.5
  rectangle: 3.605,-14 3.985,-11.5
  rectangle: 4.24,-14 4.62,-11.5
  rectangle: 4.875,-14 5.255,-11.5
  rectangle: 5.51,-14 5.89,-11.5
  rectangle: 6.145,-14 6.525,-11.5
  rectangle: 6.78,-14 7.16,-11.5
  rectangle: 7.415,-14 7.795,-11.5
  rectangle: 8.05,-14 8.43,-11.5
  rectangle: 8.685,-14 9.065,-11.5
  rectangle: 9.32,-14 9.7,-11.5
  rectangle: 9.955,-14 10.335,-11.5
  rectangle: 11.5,-10.365 14,-9.985
  rectangle: 11.5,-9.73 14,-9.35
  rectangle: 11.5,-9.095 14,-8.715
  rectangle: 11.5,-8.46 14,-8.08
  rectangle: 11.5,-7.825 14,-7.445
  rectangle: 11.5,-7.19 14,-6.81
  rectangle: 11.5,-6.555 14,-6.175
  rectangle: 11.5,-5.92 14,-5.54
  rectangle: 11.5,-5.285 14,-4.905
  rectangle: 11.5,-4.65 14,-4.27
  rectangle: 11.5,-4.015 14,-3.635
  rectangle: 11.5,-3.38 14,-3
  rectangle: 11.5,-2.745 14,-2.365
  rectangle: 11.5,-2.11 14,-1.73
  rectangle: 11.5,-1.475 14,-1.095
  rectangle: 11.5,-0.84 14,-0.46
  rectangle: 11.5,-0.205 14,0.175
  rectangle: 11.5,0.43 14,0.81
  rectangle: 11.5,1.065 14,1.445
  rectangle: 11.5,1.7 14,2.08
  rectangle: 11.5,2.335 14,2.715
  rectangle: 11.5,2.97 14,3.35
  rectangle: 11.5,3.605 14,3.985
  rectangle: 11.5,4.24 14,4.62
  rectangle: 11.5,4.875 14,5.255
  rectangle: 11.5,5.51 14,5.89
  rectangle: 11.5,6.145 14,6.525
  rectangle: 11.5,6.78 14,7.16
  rectangle: 11.5,7.415 14,7.795
  rectangle: 11.5,8.05 14,8.43
  rectangle: 11.5,8.685 14,9.065
  rectangle: 11.5,9.32 14,9.7
  rectangle: 11.5,9.955 14,10.335
  rectangle: 9.985,11.5 10.365,14
  rectangle: 9.35,11.5 9.73,14
  rectangle: 8.715,11.5 9.095,14
  rectangle: 8.08,11.5 8.46,14
  rectangle: 7.445,11.5 7.825,14
  rectangle: 6.81,11.5 7.19,14
  rectangle: 6.175,11.5 6.555,14
  rectangle: 5.54,11.5 5.92,14
  rectangle: 4.905,11.5 5.285,14
  rectangle: 4.27,11.5 4.65,14
  rectangle: 3.635,11.5 4.015,14
  rectangle: 3,11.5 3.38,14
  rectangle: 2.365,11.5 2.745,14
  rectangle: 1.73,11.5 2.11,14
  rectangle: 1.095,11.5 1.475,14
  rectangle: 0.46,11.5 0.84,14
  rectangle: -0.175,11.5 0.205,14
  rectangle: -0.81,11.5 -0.43,14
  rectangle: -1.445,11.5 -1.065,14
  rectangle: -2.08,11.5 -1.7,14
  rectangle: -2.715,11.5 -2.335,14
  rectangle: -3.35,11.5 -2.97,14
  rectangle: -3.985,11.5 -3.605,14
  rectangle: -4.62,11.5 -4.24,14
  rectangle: -5.255,11.5 -4.875,14
  rectangle: -5.89,11.5 -5.51,14
  rectangle: -6.525,11.5 -6.145,14
  rectangle: -7.16,11.5 -6.78,14
  rectangle: -7.795,11.5 -7.415,14
  rectangle: -8.43,11.5 -8.05,14
  rectangle: -9.065,11.5 -8.685,14
  rectangle: -9.7,11.5 -9.32,14
  rectangle: -10.335,11.5 -9.955,14
  rectangle: -14,9.985 -11.5,10.365
  rectangle: -14,9.35 -11.5,9.73
  rectangle: -14,8.715 -11.5,9.095
  rectangle: -14,8.08 -11.5,8.46
  rectangle: -14,7.445 -11.5,7.825
  rectangle: -14,6.81 -11.5,7.19
  rectangle: -14,6.175 -11.5,6.555
  rectangle: -14,5.54 -11.5,5.92
  rectangle: -14,4.905 -11.5,5.285
  rectangle: -14,4.27 -11.5,4.65
  rectangle: -14,3.635 -11.5,4.015
  rectangle: -14,3 -11.5,3.38
  rectangle: -14,2.365 -11.5,2.745
  rectangle: -14,1.73 -11.5,2.11
  rectangle: -14,1.095 -11.5,1.475
  rectangle: -14,0.46 -11.5,0.84
  rectangle: -14,-0.175 -11.5,0.205
  rectangle: -14,-0.81 -11.5,-0.43
  rectangle: -14,-1.445 -11.5,-1.065
  rectangle: -14,-2.08 -11.5,-1.7
  rectangle: -14,-2.715 -11.5,-2.335
  rectangle: -14,-3.35 -11.5,-2.97
  rectangle: -14,-3.985 -11.5,-3.605
  rectangle: -14,-4.62 -11.5,-4.24
  rectangle: -14,-5.255 -11.5,-4.875
  rectangle: -14,-5.89 -11.5,-5.51
  rectangle: -14,-6.525 -11.5,-6.145
  rectangle: -14,-7.16 -11.5,-6.78
  rectangle: -14,-7.795 -11.5,-7.415
  rectangle: -14,-8.43 -11.5,-8.05
  rectangle: -14,-9.065 -11.5,-8.685
  rectangle: -14,-9.7 -11.5,-9.32
  rectangle: -14,-10.335 -11.5,-9.955
Mechanical 27:
  lines w0.2: -14.903,-14.903 14.903,-14.903 14.903,14.903 -14.903,14.903 -14.903,-14.903

## CQFP-144 [mm]
pads (144):
  rect 0.35x2.2 smd: 1(-11.375,-15.1) 2(-10.725,-15.1) 3(-10.075,-15.1) 4(-9.425,-15.1) 5(-8.775,-15.1) 6(-8.125,-15.1) 7(-7.475,-15.1) 8(-6.825,-15.1) 9(-6.175,-15.1) 10(-5.525,-15.1) 11(-4.875,-15.1) 12(-4.225,-15.1) 13(-3.575,-15.1) 14(-2.925,-15.1) 15(-2.275,-15.1) 16(-1.625,-15.1) 17(-0.975,-15.1) 18(-0.325,-15.1) 19(0.325,-15.1) 20(0.975,-15.1) 21(1.625,-15.1) 22(2.275,-15.1) 23(2.925,-15.1) 24(3.575,-15.1) 25(4.225,-15.1) 26(4.875,-15.1) 27(5.525,-15.1) 28(6.175,-15.1) 29(6.825,-15.1) 30(7.475,-15.1) 31(8.125,-15.1) 32(8.775,-15.1) 33(9.425,-15.1) 34(10.075,-15.1) 35(10.725,-15.1) 36(11.375,-15.1) 73(11.375,15.1) 74(10.725,15.1) 75(10.075,15.1) 76(9.425,15.1) 77(8.775,15.1) 78(8.125,15.1) 79(7.475,15.1) 80(6.825,15.1) 81(6.175,15.1) 82(5.525,15.1) 83(4.875,15.1) 84(4.225,15.1) 85(3.575,15.1) 86(2.925,15.1) 87(2.275,15.1) 88(1.625,15.1) 89(0.975,15.1) 90(0.325,15.1) 91(-0.325,15.1) 92(-0.975,15.1) 93(-1.625,15.1) 94(-2.275,15.1) 95(-2.925,15.1) 96(-3.575,15.1) 97(-4.225,15.1) 98(-4.875,15.1) 99(-5.525,15.1) 100(-6.175,15.1) 101(-6.825,15.1) 102(-7.475,15.1) 103(-8.125,15.1) 104(-8.775,15.1) 105(-9.425,15.1) 106(-10.075,15.1) 107(-10.725,15.1) 108(-11.375,15.1)
  rect 2.2x0.35 smd: 37(15.1,-11.375) 38(15.1,-10.725) 39(15.1,-10.075) 40(15.1,-9.425) 41(15.1,-8.775) 42(15.1,-8.125) 43(15.1,-7.475) 44(15.1,-6.825) 45(15.1,-6.175) 46(15.1,-5.525) 47(15.1,-4.875) 48(15.1,-4.225) 49(15.1,-3.575) 50(15.1,-2.925) 51(15.1,-2.275) 52(15.1,-1.625) 53(15.1,-0.975) 54(15.1,-0.325) 55(15.1,0.325) 56(15.1,0.975) 57(15.1,1.625) 58(15.1,2.275) 59(15.1,2.925) 60(15.1,3.575) 61(15.1,4.225) 62(15.1,4.875) 63(15.1,5.525) 64(15.1,6.175) 65(15.1,6.825) 66(15.1,7.475) 67(15.1,8.125) 68(15.1,8.775) 69(15.1,9.425) 70(15.1,10.075) 71(15.1,10.725) 72(15.1,11.375) 109(-15.1,11.375) 110(-15.1,10.725) 111(-15.1,10.075) 112(-15.1,9.425) 113(-15.1,8.775) 114(-15.1,8.125) 115(-15.1,7.475) 116(-15.1,6.825) 117(-15.1,6.175) 118(-15.1,5.525) 119(-15.1,4.875) 120(-15.1,4.225) 121(-15.1,3.575) 122(-15.1,2.925) 123(-15.1,2.275) 124(-15.1,1.625) 125(-15.1,0.975) 126(-15.1,0.325) 127(-15.1,-0.325) 128(-15.1,-0.975) 129(-15.1,-1.625) 130(-15.1,-2.275) 131(-15.1,-2.925) 132(-15.1,-3.575) 133(-15.1,-4.225) 134(-15.1,-4.875) 135(-15.1,-5.525) 136(-15.1,-6.175) 137(-15.1,-6.825) 138(-15.1,-7.475) 139(-15.1,-8.125) 140(-15.1,-8.775) 141(-15.1,-9.425) 142(-15.1,-10.075) 143(-15.1,-10.725) 144(-15.1,-11.375)
Top Overlay:
  lines w0.203: -13.9,13 -13,13.9 ; -13.8,-12.2 -12.5,-12.2 -12.5,-12.9 -13.9,-12.9 -13.9,-13 -13,-13.9 ; 13,-13.9 13.9,-13 ; 13,13.9 13.9,13
Mechanical 16:
  rectangle: -11.495,-15.6 -11.255,-13.9
  rectangle: -10.845,-15.6 -10.605,-13.9
  rectangle: -10.195,-15.6 -9.955,-13.9
  rectangle: -9.545,-15.6 -9.305,-13.9
  rectangle: -8.895,-15.6 -8.655,-13.9
  rectangle: -8.245,-15.6 -8.005,-13.9
  rectangle: -7.595,-15.6 -7.355,-13.9
  rectangle: -6.945,-15.6 -6.705,-13.9
  rectangle: -6.295,-15.6 -6.055,-13.9
  rectangle: -5.645,-15.6 -5.405,-13.9
  rectangle: -4.995,-15.6 -4.755,-13.9
  rectangle: -4.345,-15.6 -4.105,-13.9
  rectangle: -3.695,-15.6 -3.455,-13.9
  rectangle: -3.045,-15.6 -2.805,-13.9
  rectangle: -2.395,-15.6 -2.155,-13.9
  rectangle: -1.745,-15.6 -1.505,-13.9
  rectangle: -1.095,-15.6 -0.855,-13.9
  rectangle: -0.445,-15.6 -0.205,-13.9
  rectangle: 0.205,-15.6 0.445,-13.9
  rectangle: 0.855,-15.6 1.095,-13.9
  rectangle: 1.505,-15.6 1.745,-13.9
  rectangle: 2.155,-15.6 2.395,-13.9
  rectangle: 2.805,-15.6 3.045,-13.9
  rectangle: 3.455,-15.6 3.695,-13.9
  rectangle: 4.105,-15.6 4.345,-13.9
  rectangle: 4.755,-15.6 4.995,-13.9
  rectangle: 5.405,-15.6 5.645,-13.9
  rectangle: 6.055,-15.6 6.295,-13.9
  rectangle: 6.705,-15.6 6.945,-13.9
  rectangle: 7.355,-15.6 7.595,-13.9
  rectangle: 8.005,-15.6 8.245,-13.9
  rectangle: 8.655,-15.6 8.895,-13.9
  rectangle: 9.305,-15.6 9.545,-13.9
  rectangle: 9.955,-15.6 10.195,-13.9
  rectangle: 10.605,-15.6 10.845,-13.9
  rectangle: 11.255,-15.6 11.495,-13.9
  rectangle: 13.9,-11.495 15.6,-11.255
  rectangle: 13.9,-10.845 15.6,-10.605
  rectangle: 13.9,-10.195 15.6,-9.955
  rectangle: 13.9,-9.545 15.6,-9.305
  rectangle: 13.9,-8.895 15.6,-8.655
  rectangle: 13.9,-8.245 15.6,-8.005
  rectangle: 13.9,-7.595 15.6,-7.355
  rectangle: 13.9,-6.945 15.6,-6.705
  rectangle: 13.9,-6.295 15.6,-6.055
  rectangle: 13.9,-5.645 15.6,-5.405
  rectangle: 13.9,-4.995 15.6,-4.755
  rectangle: 13.9,-4.345 15.6,-4.105
  rectangle: 13.9,-3.695 15.6,-3.455
  rectangle: 13.9,-3.045 15.6,-2.805
  rectangle: 13.9,-2.395 15.6,-2.155
  rectangle: 13.9,-1.745 15.6,-1.505
  rectangle: 13.9,-1.095 15.6,-0.855
  rectangle: 13.9,-0.445 15.6,-0.205
  rectangle: 13.9,0.205 15.6,0.445
  rectangle: 13.9,0.855 15.6,1.095
  rectangle: 13.9,1.505 15.6,1.745
  rectangle: 13.9,2.155 15.6,2.395
  rectangle: 13.9,2.805 15.6,3.045
  rectangle: 13.9,3.455 15.6,3.695
  rectangle: 13.9,4.105 15.6,4.345
  rectangle: 13.9,4.755 15.6,4.995
  rectangle: 13.9,5.405 15.6,5.645
  rectangle: 13.9,6.055 15.6,6.295
  rectangle: 13.9,6.705 15.6,6.945
  rectangle: 13.9,7.355 15.6,7.595
  rectangle: 13.9,8.005 15.6,8.245
  rectangle: 13.9,8.655 15.6,8.895
  rectangle: 13.9,9.305 15.6,9.545
  rectangle: 13.9,9.955 15.6,10.195
  rectangle: 13.9,10.605 15.6,10.845
  rectangle: 13.9,11.255 15.6,11.495
  rectangle: 11.255,13.9 11.495,15.6
  rectangle: 10.605,13.9 10.845,15.6
  rectangle: 9.955,13.9 10.195,15.6
  rectangle: 9.305,13.9 9.545,15.6
  rectangle: 8.655,13.9 8.895,15.6
  rectangle: 8.005,13.9 8.245,15.6
  rectangle: 7.355,13.9 7.595,15.6
  rectangle: 6.705,13.9 6.945,15.6
  rectangle: 6.055,13.9 6.295,15.6
  rectangle: 5.405,13.9 5.645,15.6
  rectangle: 4.755,13.9 4.995,15.6
  rectangle: 4.105,13.9 4.345,15.6
  rectangle: 3.455,13.9 3.695,15.6
  rectangle: 2.805,13.9 3.045,15.6
  rectangle: 2.155,13.9 2.395,15.6
  rectangle: 1.505,13.9 1.745,15.6
  rectangle: 0.855,13.9 1.095,15.6
  rectangle: 0.205,13.9 0.445,15.6
  rectangle: -0.445,13.9 -0.205,15.6
  rectangle: -1.095,13.9 -0.855,15.6
  rectangle: -1.745,13.9 -1.505,15.6
  rectangle: -2.395,13.9 -2.155,15.6
  rectangle: -3.045,13.9 -2.805,15.6
  rectangle: -3.695,13.9 -3.455,15.6
  rectangle: -4.345,13.9 -4.105,15.6
  rectangle: -4.995,13.9 -4.755,15.6
  rectangle: -5.645,13.9 -5.405,15.6
  rectangle: -6.295,13.9 -6.055,15.6
  rectangle: -6.945,13.9 -6.705,15.6
  rectangle: -7.595,13.9 -7.355,15.6
  rectangle: -8.245,13.9 -8.005,15.6
  rectangle: -8.895,13.9 -8.655,15.6
  rectangle: -9.545,13.9 -9.305,15.6
  rectangle: -10.195,13.9 -9.955,15.6
  rectangle: -10.845,13.9 -10.605,15.6
  rectangle: -11.495,13.9 -11.255,15.6
  rectangle: -15.6,11.255 -13.9,11.495
  rectangle: -15.6,10.605 -13.9,10.845
  rectangle: -15.6,9.955 -13.9,10.195
  rectangle: -15.6,9.305 -13.9,9.545
  rectangle: -15.6,8.655 -13.9,8.895
  rectangle: -15.6,8.005 -13.9,8.245
  rectangle: -15.6,7.355 -13.9,7.595
  rectangle: -15.6,6.705 -13.9,6.945
  rectangle: -15.6,6.055 -13.9,6.295
  rectangle: -15.6,5.405 -13.9,5.645
  rectangle: -15.6,4.755 -13.9,4.995
  rectangle: -15.6,4.105 -13.9,4.345
  rectangle: -15.6,3.455 -13.9,3.695
  rectangle: -15.6,2.805 -13.9,3.045
  rectangle: -15.6,2.155 -13.9,2.395
  rectangle: -15.6,1.505 -13.9,1.745
  rectangle: -15.6,0.855 -13.9,1.095
  rectangle: -15.6,0.205 -13.9,0.445
  rectangle: -15.6,-0.445 -13.9,-0.205
  rectangle: -15.6,-1.095 -13.9,-0.855
  rectangle: -15.6,-1.745 -13.9,-1.505
  rectangle: -15.6,-2.395 -13.9,-2.155
  rectangle: -15.6,-3.045 -13.9,-2.805
  rectangle: -15.6,-3.695 -13.9,-3.455
  rectangle: -15.6,-4.345 -13.9,-4.105
  rectangle: -15.6,-4.995 -13.9,-4.755
  rectangle: -15.6,-5.645 -13.9,-5.405
  rectangle: -15.6,-6.295 -13.9,-6.055
  rectangle: -15.6,-6.945 -13.9,-6.705
  rectangle: -15.6,-7.595 -13.9,-7.355
  rectangle: -15.6,-8.245 -13.9,-8.005
  rectangle: -15.6,-8.895 -13.9,-8.655
  rectangle: -15.6,-9.545 -13.9,-9.305
  rectangle: -15.6,-10.195 -13.9,-9.955
  rectangle: -15.6,-10.845 -13.9,-10.605
  rectangle: -15.6,-11.495 -13.9,-11.255
  lines w0.203: -13.9,-12.9 -13.9,13 ; -13,-13.9 13,-13.9 ; -13,13.9 13,13.9 ; 13.9,-13 13.9,13
Mechanical 27:
  lines w0.2: -16.903,-16.903 16.903,-16.903 16.903,16.903 -16.903,16.903 -16.903,-16.903